# Altium footprint library WR-TBL_Rising Cage Clamp.PcbLib: 435 footprints (part 9 of 28)
Each footprint in its own frame and in the unit in brackets; x right, y up, seen from the top. Pads: shape width x height; smd on the part's side, far side on the other; paste and mask are expansions set on the pad; w line width, h text height; cw(c..) or ccw(c..) is an arc to the next point about the centre after c.
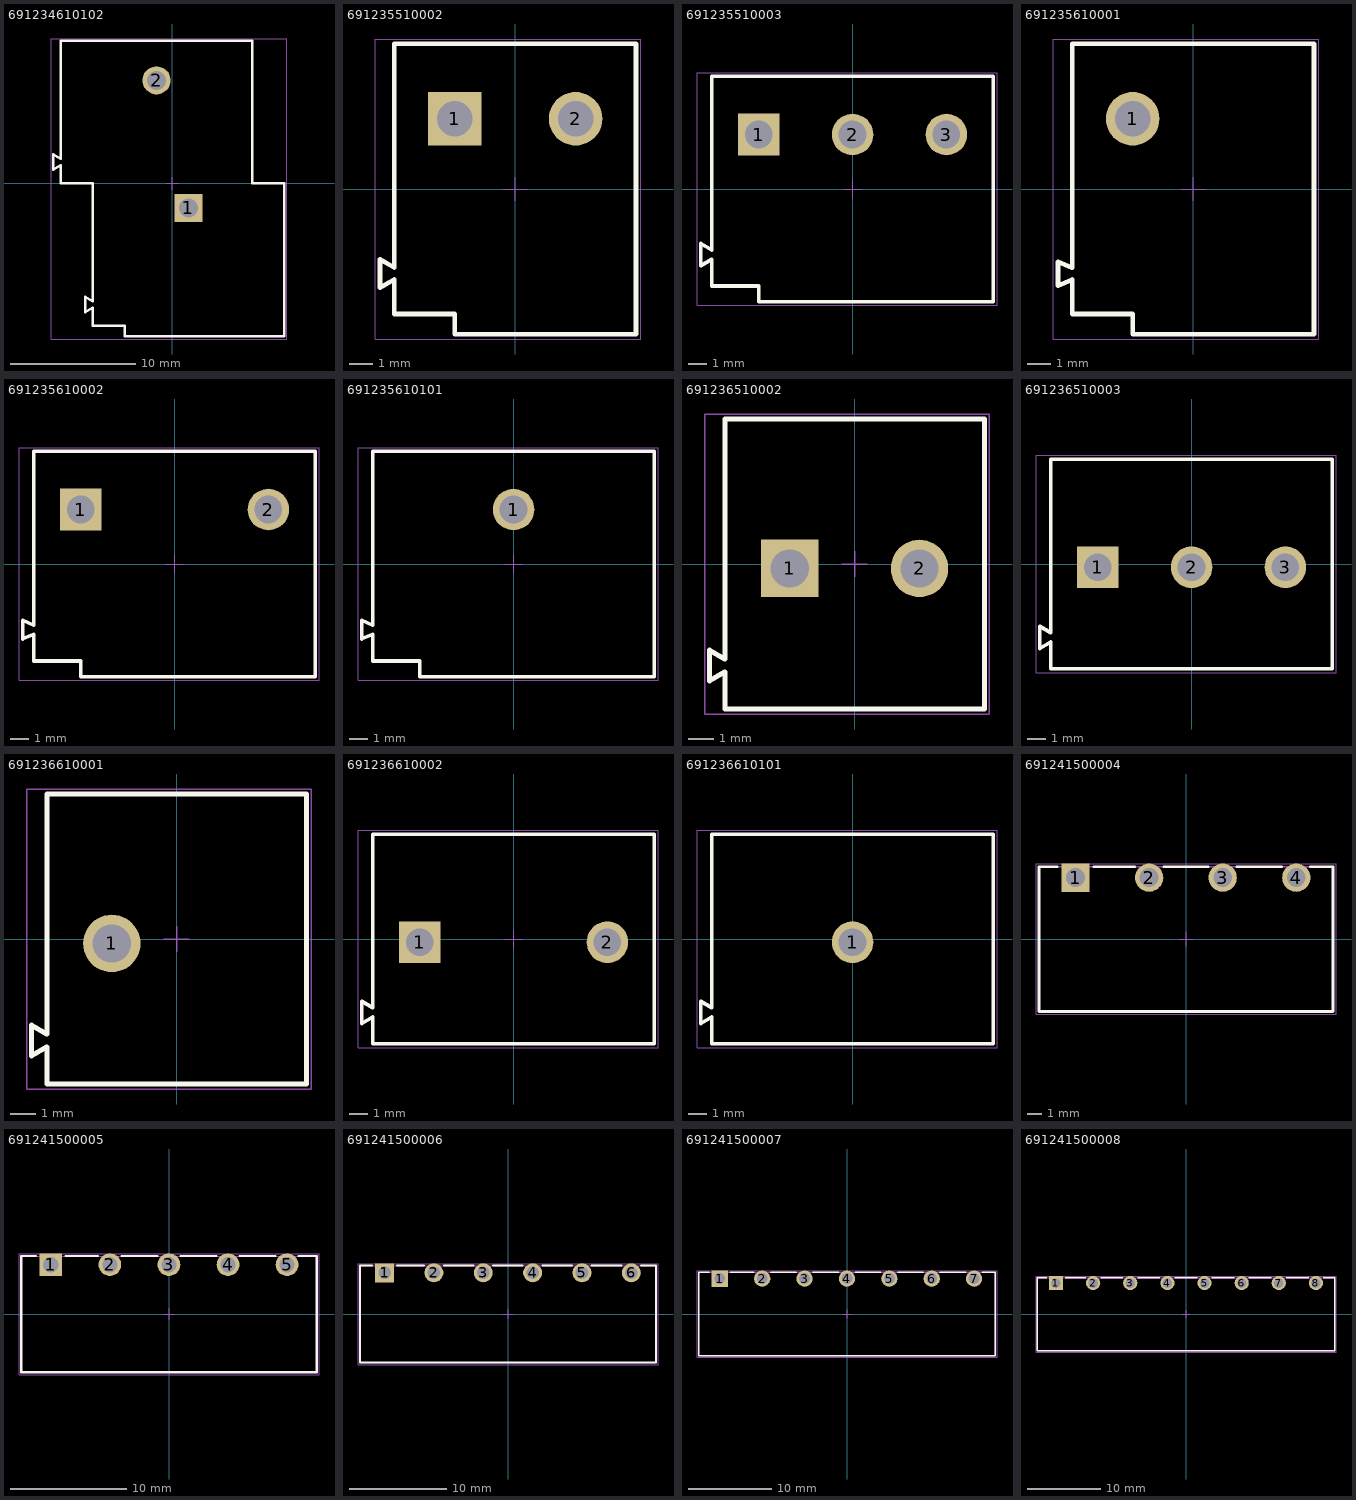
[diagram p8: the footprints below, top view; thin cyan lines are the x and y axes]

## 691234610102 [mm] "Horizontal Cable Entry with Rising Cage Clamp, pitch 10.16mm, 02p"
height 45
pads (2):
  rect 2.25x2.25 hole 1.5: 1(1.27,-1.96)
  round 2.25 hole 1.5: 2(-1.27,8.2)
Top Overlay:
  lines w0.2: -9.492,1.1 -9.492,2.3 -8.89,1.954 -8.89,11.35 6.35,11.35 6.35,0 8.89,0 8.89,-12.2 -3.81,-12.2 -3.81,-11.35 -6.35,-11.35 -6.35,-9.904 -6.952,-10.25 -6.952,-9.05 -6.35,-9.396 -6.35,0 -8.89,0 -8.89,1.446 -9.492,1.1
Mechanical 13:
  lines w0.1: -9.492,1.1 -8.89,1.446 -8.89,0 -6.35,0 -6.35,-9.396 -6.952,-9.05 -6.952,-10.25 -6.35,-9.904 -6.35,-11.35 -3.81,-11.35 -3.81,-12.2 8.89,-12.2 8.89,0 6.35,0 6.35,11.35 -8.89,11.35 -8.89,1.954 -9.492,2.3 -9.492,1.1
Mechanical 15:
  lines w0.05: -0.5,0 0.5,0 ; 0,-0.5 0,0.5 ; -9.64,-12.4 9.09,-12.4 9.09,11.5 -9.64,11.5 -9.64,-12.4
3D body "691234610102.stp": height 45.1, standoff -3.9, extent -9.49,-12.2 8.89,11.35

## 691235510002 [mm] "Horizontal Cable Entry with Rising Cage Clamp, pitch 5.08, 02p"
height 45
pads (2):
  rect 2.25x2.25 hole 1.5: 1(-2.54,2.95)
  round 2.25 hole 1.5: 2(2.54,2.95)
Top Overlay:
  lines w0.2: -5.081,-3.798 -5.68,-4.15 -5.68,-2.95 -5.081,-3.301 ; -5.08,-3.8 -5.08,-5.25 -2.54,-5.25 -2.54,-6.1 5.08,-6.1 5.08,6.1 -5.08,6.1 ; -5.08,-3.301 -5.08,6.099
Mechanical 13:
  lines w0.1: -5.081,-3.798 -5.68,-4.15 -5.68,-2.95 -5.081,-3.301 ; -5.08,-3.8 -5.08,-5.25 -2.54,-5.25 -2.54,-6.1 5.08,-6.1 5.08,6.1 -5.08,6.1 ; -5.08,-3.301 -5.08,6.099
Mechanical 15:
  lines w0.05: -0.5,0 0.5,0 ; 0,-0.5 0,0.5 ; -5.88,-6.3 5.28,-6.3 5.28,6.3 -5.88,6.3 -5.88,-6.3
3D body "691235510002.stp": height 45.1, standoff -3.9, extent -5.68,-6.1 5.08,6.1

## 691235510003 [mm] "Horizontal Cable Entry with Rising Cage Clamp, pitch 5.08, 03p"
height 45
pads (3):
  rect 2.25x2.25 hole 1.5: 1(-5.08,2.95)
  round 2.25 hole 1.5: 2(0,2.95) 3(5.08,2.95)
Top Overlay:
  lines w0.2: -7.621,-3.798 -8.22,-4.15 -8.22,-2.95 -7.621,-3.301 ; -7.62,-3.8 -7.62,-5.25 -5.08,-5.25 -5.08,-6.1 7.62,-6.1 7.62,6.1 -7.62,6.1 ; -7.62,-3.301 -7.62,6.099
Mechanical 13:
  lines w0.1: -7.621,-3.798 -8.22,-4.15 -8.22,-2.95 -7.621,-3.301 ; -7.62,-3.8 -7.62,-5.25 -5.08,-5.25 -5.08,-6.1 7.62,-6.1 7.62,6.1 -7.62,6.1 ; -7.62,-3.301 -7.62,6.099
Mechanical 15:
  lines w0.05: -0.5,0 0.5,0 ; 0,-0.5 0,0.5 ; -8.42,-6.3 -8.42,6.3 7.82,6.3 7.82,-6.3 -8.42,-6.3
3D body "691235510003.stp": height 45.1, standoff -3.9, extent -8.22,-6.1 7.62,6.1

## 691235610001 [mm] "Horizontal Cable Entry with Rising Cage Clamp, pitch 10.16mm, 01p"
height 45
pads (1):
  round 2.25 hole 1.5: 1(-2.54,2.95)
Top Overlay:
  lines w0.2: -5.081,-3.805 -5.68,-4.057 -5.68,-3.057 -5.081,-3.309 -5.081,6.099 ; -5.08,-3.807 -5.08,-5.25 -2.54,-5.25 -2.54,-6.1 5.08,-6.1 5.08,6.1 -5.08,6.1
Mechanical 13:
  lines w0.1: -5.081,-3.805 -5.68,-4.057 -5.68,-3.057 -5.081,-3.309 -5.081,6.099 ; -5.08,-3.807 -5.08,-5.25 -2.54,-5.25 -2.54,-6.1 5.08,-6.1 5.08,6.1 -5.08,6.1
Mechanical 15:
  lines w0.05: -0.5,0 0.5,0 ; 0,-0.5 0,0.5 ; -5.88,-6.3 -5.88,6.3 5.28,6.3 5.28,-6.3 -5.88,-6.3
3D body "691235610001.stp": height 45.1, standoff -3.9, extent -5.68,-6.1 5.08,6.1

## 691235610002 [mm] "Horizontal Cable Entry with Rising Cage Clamp, pitch 10.16mm, 02p"
height 45
pads (2):
  rect 2.25x2.25 hole 1.5: 1(-5.08,2.95)
  round 2.25 hole 1.5: 2(5.08,2.95)
Top Overlay:
  lines w0.2: -7.621,-3.805 -8.22,-4.057 -8.22,-3.057 -7.621,-3.309 -7.621,6.099 ; -7.62,-3.807 -7.62,-5.25 -5.08,-5.25 -5.08,-6.1 7.62,-6.1 7.62,6.1 -7.62,6.1
Mechanical 13:
  lines w0.1: -7.621,-3.805 -8.22,-4.057 -8.22,-3.057 -7.621,-3.309 -7.621,6.099 ; -7.62,-3.807 -7.62,-5.25 -5.08,-5.25 -5.08,-6.1 7.62,-6.1 7.62,6.1 -7.62,6.1
Mechanical 15:
  lines w0.05: -0.5,0 0.5,0 ; 0,-0.5 0,0.5 ; -8.42,-6.3 -8.42,6.3 7.82,6.3 7.82,-6.3 -8.42,-6.3
3D body "691235610002.stp": height 45.1, standoff -3.9, extent -8.22,-6.1 7.62,6.1

## 691235610101 [mm] "Horizontal Cable Entry with Rising Cage Clamp, pitch 10.16mm, 01p"
height 45
pads (1):
  round 2.25 hole 1.5: 1(0,2.95)
Top Overlay:
  lines w0.2: -7.621,-3.805 -8.22,-4.057 -8.22,-3.057 -7.621,-3.309 -7.621,6.099 ; -7.62,-3.807 -7.62,-5.25 -5.08,-5.25 -5.08,-6.1 7.62,-6.1 7.62,6.1 -7.62,6.1
Mechanical 13:
  lines w0.1: -7.621,-3.805 -8.22,-4.057 -8.22,-3.057 -7.621,-3.309 -7.621,6.099 ; -7.62,-3.807 -7.62,-5.25 -5.08,-5.25 -5.08,-6.1 7.62,-6.1 7.62,6.1 -7.62,6.1
Mechanical 15:
  lines w0.05: -0.5,0 0.5,0 ; 0,-0.5 0,0.5 ; -8.42,-6.3 7.82,-6.3 7.82,6.3 -8.42,6.3 -8.42,-6.3
3D body "691235610101.stp": height 45.1, standoff -3.9, extent -8.22,-6.1 7.62,6.1

## 691236510002 [mm] "Horizontal Cable Entry with Rising Cage Clamp, pitch 5.08mm, 02p"
height 18
pads (2):
  rect 2.25x2.25 hole 1.5: 1(-2.54,-0.175)
  round 2.25 hole 1.5: 2(2.54,-0.175)
Top Overlay:
  lines w0.2: -5.081,-4.223 -5.68,-4.575 -5.68,-3.375 -5.081,-3.727 ; -5.08,-4.225 -5.08,-5.675 5.08,-5.675 5.08,5.675 -5.08,5.675 -5.08,-3.726
Mechanical 13:
  lines w0.1: -5.081,-4.223 -5.68,-4.575 -5.68,-3.375 -5.081,-3.727 ; -5.08,-4.225 -5.08,-5.675 5.08,-5.675 5.08,5.675 -5.08,5.675 -5.08,-3.726
Mechanical 15:
  lines w0.05: -0.5,0 0.5,0 ; 0,-0.5 0,0.5 ; -5.88,-5.875 -5.88,5.875 5.28,5.875 5.28,-5.875 -5.88,-5.875
3D body "691236510002.stp": height 18.1, standoff -3.9, extent -5.68,-5.675 5.08,5.675

## 691236510003 [mm] "Horizontal Cable Entry with Rising Cage Clamp, pitch 5.08mm, 03p"
height 18
pads (3):
  rect 2.25x2.25 hole 1.5: 1(-5.08,-0.175)
  round 2.25 hole 1.5: 2(0,-0.175) 3(5.08,-0.175)
Top Overlay:
  lines w0.2: -7.621,-4.223 -8.22,-4.575 -8.22,-3.375 -7.621,-3.727 ; -7.62,-4.225 -7.62,-5.675 7.62,-5.675 7.62,5.675 -7.62,5.675 -7.62,-3.726
Mechanical 13:
  lines w0.1: -7.621,-4.223 -8.22,-4.575 -8.22,-3.375 -7.621,-3.727 ; -7.62,-4.225 -7.62,-5.675 7.62,-5.675 7.62,5.675 -7.62,5.675 -7.62,-3.726
Mechanical 15:
  lines w0.05: -0.5,0 0.5,0 ; 0,-0.5 0,0.5 ; -8.42,-5.875 7.82,-5.875 7.82,5.875 -8.42,5.875 -8.42,-5.875
3D body "691236510003.stp": height 18.1, standoff -3.9, extent -8.22,-5.675 7.62,5.675

## 691236610001 [mm] "Horizontal Cable Entry with Rising Cage Clamp, pitch 10.16mm, 01p"
height 18
pads (1):
  round 2.25 hole 1.5: 1(-2.54,-0.175)
Top Overlay:
  lines w0.2: -5.081,-4.223 -5.68,-4.575 -5.68,-3.375 -5.081,-3.727 -5.081,5.674 ; -5.08,-4.225 -5.08,-5.675 5.08,-5.675 5.08,5.675 -5.08,5.675
Mechanical 13:
  lines w0.1: -5.081,-4.223 -5.68,-4.575 -5.68,-3.375 -5.081,-3.727 -5.081,5.674 ; -5.08,-4.225 -5.08,-5.675 5.08,-5.675 5.08,5.675 -5.08,5.675
Mechanical 15:
  lines w0.05: -0.5,0 0.5,0 ; 0,-0.5 0,0.5 ; -5.88,-5.875 -5.88,5.875 5.28,5.875 5.28,-5.875 -5.88,-5.875
3D body "691236610001.stp": height 18.1, standoff -3.9, extent -5.68,-5.675 5.08,5.675

## 691236610002 [mm] "Horizontal Cable Entry with Rising Cage Clamp, pitch 10.16mm, 02p"
height 18
pads (2):
  rect 2.25x2.25 hole 1.5: 1(-5.08,-0.175)
  round 2.25 hole 1.5: 2(5.08,-0.175)
Top Overlay:
  lines w0.2: -7.621,-4.223 -8.22,-4.575 -8.22,-3.375 -7.621,-3.727 -7.621,5.674 ; -7.62,-4.225 -7.62,-5.675 7.62,-5.675 7.62,5.675 -7.62,5.675
Mechanical 13:
  lines w0.1: -7.621,-4.223 -8.22,-4.575 -8.22,-3.375 -7.621,-3.727 -7.621,5.674 ; -7.62,-4.225 -7.62,-5.675 7.62,-5.675 7.62,5.675 -7.62,5.675
Mechanical 15:
  lines w0.05: -0.5,0 0.5,0 ; 0,-0.5 0,0.5 ; -8.42,-5.875 7.82,-5.875 7.82,5.875 -8.42,5.875 -8.42,-5.875
3D body "691236610002.stp": height 18.1, standoff -3.9, extent -8.22,-5.675 7.62,5.675

## 691236610101 [mm] "Horizontal Cable Entry with Rising Cage Clamp, pitch 10.16mm, 01p"
height 18
pads (1):
  round 2.25 hole 1.5: 1(0,-0.175)
Top Overlay:
  lines w0.2: -7.621,-4.223 -8.22,-4.575 -8.22,-3.375 -7.621,-3.727 -7.621,5.674 ; -7.62,-4.225 -7.62,-5.675 7.62,-5.675 7.62,5.675 -7.62,5.675
Mechanical 13:
  lines w0.1: -7.621,-4.223 -8.22,-4.575 -8.22,-3.375 -7.621,-3.727 -7.621,5.674 ; -7.62,-4.225 -7.62,-5.675 7.62,-5.675 7.62,5.675 -7.62,5.675
Mechanical 15:
  lines w0.05: -0.5,0 0.5,0 ; 0,-0.5 0,0.5 ; -8.42,-5.875 7.82,-5.875 7.82,5.875 -8.42,5.875 -8.42,-5.875
3D body "691236610101.stp": height 18.1, standoff -3.9, extent -8.22,-5.675 7.62,5.675

## 691241500004 [mm] "Serie 2415-5.08mm Vertical Cable Entry with Rising Cage Clamp, 4 pins"
height 8.1
pads (4):
  rect 1.95x1.95 hole 1.3: 1(-7.625,4.25)
  round 1.95 hole 1.3: 2(-2.545,4.25) 3(2.535,4.25) 4(7.615,4.25)
Top Overlay:
  lines w0.2: -8.91,5 -10.16,5 -10.16,-5 10.16,-5 10.16,5 8.61,5 ; -6.36,5 -3.56,5 ; -1.53,5 1.54,5 ; 3.53,5 6.6,5
Mechanical 13:
  lines w0.1: -10.16,-5 -10.16,5 10.16,5 10.16,-5 -10.16,-5
Mechanical 15:
  lines w0.05: -0.5,0 0.5,0 ; 0,-0.5 0,0.5 ; -10.36,-5.2 10.36,-5.2 10.36,5.2 -10.36,5.2 -10.36,-5.2
3D body "691241500004.stp": height 8.2, standoff -3.4, extent -10.165,-5 10.155,5

## 691241500005 [mm] "Serie 2415-5.08mm Vertical Cable Entry with Rising Cage Clamp, 5 pins"
height 8.1
pads (5):
  rect 1.95x1.95 hole 1.3: 1(-10.165,4.25)
  round 1.95 hole 1.3: 2(-5.085,4.25) 3(-0.005,4.25) 4(5.075,4.25) 5(10.155,4.25)
Top Overlay:
  lines w0.2: -11.45,5 -12.7,5 -12.7,-5 12.7,-5 12.7,5 11.15,5 ; -8.9,5 -6.1,5 ; -4.07,5 -1,5 ; 0.99,5 4.06,5 ; 6.07,5 9.14,5
Mechanical 13:
  lines w0.1: -12.7,-5 12.7,-5 12.7,5 -12.7,5 -12.7,-5
Mechanical 15:
  lines w0.05: -0.5,0 0.5,0 ; 0,-0.5 0,0.5 ; -12.9,-5.2 -12.9,5.2 12.9,5.2 12.9,-5.2 -12.9,-5.2
3D body "691241500005.stp": height 8.2, standoff -3.4, extent -12.705,-5 12.695,5

## 691241500006 [mm] "Serie 2415-5.08mm Vertical Cable Entry with Rising Cage Clamp, 6 pins"
height 8.1
pads (6):
  rect 1.95x1.95 hole 1.3: 1(-12.705,4.25)
  round 1.95 hole 1.3: 2(-7.625,4.25) 3(-2.545,4.25) 4(2.535,4.25) 5(7.615,4.25) 6(12.695,4.25)
Top Overlay:
  lines w0.2: -13.99,5 -15.24,5 -15.24,-5 15.24,-5 15.24,5 13.69,5 ; -11.44,5 -8.64,5 ; -6.61,5 -3.54,5 ; -1.55,5 1.52,5 ; 3.53,5 6.6,5 ; 8.61,5 11.68,5
Mechanical 13:
  lines w0.1: -15.24,-5 15.24,-5 15.24,5 -15.24,5 -15.24,-5
Mechanical 15:
  lines w0.05: -0.5,0 0.5,0 ; 0,-0.5 0,0.5 ; -15.44,-5.2 -15.44,5.2 15.44,5.2 15.44,-5.2 -15.44,-5.2
3D body "691241500006.stp": height 8.2, standoff -3.4, extent -15.245,-5 15.235,5

## 691241500007 [mm] "Serie 2415-5.08mm Vertical Cable Entry with Rising Cage Clamp, 7 pins"
height 8.1
pads (7):
  rect 1.95x1.95 hole 1.3: 1(-15.245,4.25)
  round 1.95 hole 1.3: 2(-10.165,4.25) 3(-5.085,4.25) 4(-0.005,4.25) 5(5.075,4.25) 6(10.155,4.25) 7(15.235,4.25)
Top Overlay:
  lines w0.2: -16.53,5 -17.78,5 -17.78,-5 17.78,-5 17.78,5 16.23,5 ; -13.98,5 -11.18,5 ; -9.15,5 -6.08,5 ; -4.09,5 -1.02,5 ; 0.99,5 4.06,5 ; 6.07,5 9.14,5 ; 11.15,5 14.22,5
Mechanical 13:
  lines w0.1: -17.78,-5 -17.78,5 17.78,5 17.78,-5 -17.78,-5
Mechanical 15:
  lines w0.05: -0.5,0 0.5,0 ; 0,-0.5 0,0.5 ; -17.98,-5.2 17.98,-5.2 17.98,5.2 -17.98,5.2 -17.98,-5.2
3D body "691241500007.stp": height 8.2, standoff -3.4, extent -17.785,-5 17.775,5

## 691241500008 [mm] "Serie 2415-5.08mm Vertical Cable Entry with Rising Cage Clamp, 8 pins"
height 8.1
pads (8):
  rect 1.95x1.95 hole 1.3: 1(-17.785,4.25)
  round 1.95 hole 1.3: 2(-12.705,4.25) 3(-7.625,4.25) 4(-2.545,4.25) 5(2.535,4.25) 6(7.615,4.25) 7(12.695,4.25) 8(17.775,4.25)
Top Overlay:
  lines w0.2: -19.07,5 -20.32,5 -20.32,-5 20.32,-5 20.32,5 18.77,5 ; -16.52,5 -13.72,5 ; -11.69,5 -8.62,5 ; -6.63,5 -3.56,5 ; -1.55,5 1.52,5 ; 3.53,5 6.6,5 ; 8.61,5 11.68,5 ; 13.69,5 16.76,5
Mechanical 13:
  lines w0.1: -20.32,-5 -20.32,5 20.32,5 20.32,-5 -20.32,-5
Mechanical 15:
  lines w0.05: -0.5,0 0.5,0 ; 0,-0.5 0,0.5 ; -20.52,-5.2 20.52,-5.2 20.52,5.2 -20.52,5.2 -20.52,-5.2
3D body "691241500008.stp": height 8.2, standoff -3.4, extent -20.325,-5 20.315,5